# Altium footprint library Connectors THD.PcbLib: 631 footprints (part 16 of 46)
Each footprint in its own frame and in the unit in brackets; x right, y up, seen from the top. Pads: shape width x height; smd on the part's side, far side on the other; paste and mask are expansions set on the pad; w line width, h text height; cw(c..) or ccw(c..) is an arc to the next point about the centre after c.
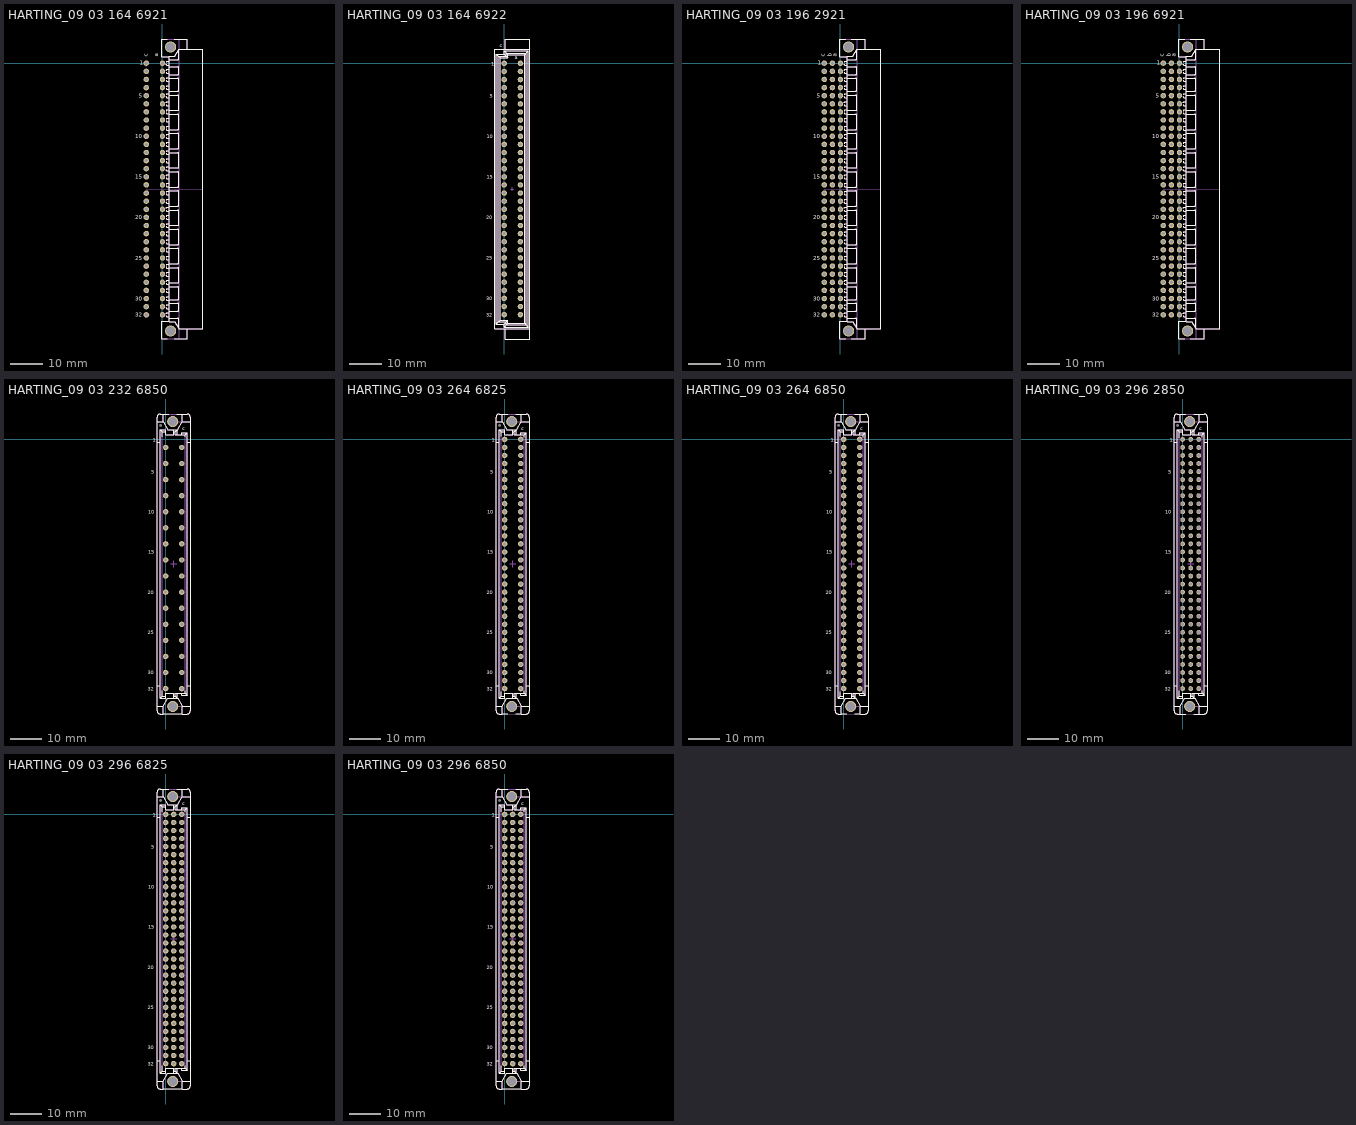
[diagram p15: the footprints below, top view; thin cyan lines are the x and y axes]

## HARTING_09 03 164 6921 [mm] "Connector; DIN 41612, Type C, Thru-Hole; Rows a+c, 64 Position; Right Angle"
height 9.35
pads (66):
  round 1.7 hole 1: a1(0,0) a2(0,-2.54) a3(0,-5.08) a4(0,-7.62) a5(0,-10.16) a6(0,-12.7) a7(0,-15.24) a8(0,-17.78) a9(0,-20.32) a10(0,-22.86) a11(0,-25.4) a12(0,-27.94) a13(0,-30.48) a14(0,-33.02) a15(0,-35.56) a16(0,-38.1) a17(0,-40.64) a18(0,-43.18) a19(0,-45.72) a20(0,-48.26) a21(0,-50.8) a22(0,-53.34) a23(0,-55.88) a24(0,-58.42) a25(0,-60.96) a26(0,-63.5) a27(0,-66.04) a28(0,-68.58) a29(0,-71.12) a30(0,-73.66) a31(0,-76.2) a32(0,-78.74) c1(-5.08,0) c2(-5.08,-2.54) c3(-5.08,-5.08) c4(-5.08,-7.62) c5(-5.08,-10.16) c6(-5.08,-12.7) c7(-5.08,-15.24) c8(-5.08,-17.78) c9(-5.08,-20.32) c10(-5.08,-22.86) c11(-5.08,-25.4) c12(-5.08,-27.94) c13(-5.08,-30.48) c14(-5.08,-33.02) c15(-5.08,-35.56) c16(-5.08,-38.1) c17(-5.08,-40.64) c18(-5.08,-43.18) c19(-5.08,-45.72) c20(-5.08,-48.26) c21(-5.08,-50.8) c22(-5.08,-53.34) c23(-5.08,-55.88) c24(-5.08,-58.42) c25(-5.08,-60.96) c26(-5.08,-63.5) c27(-5.08,-66.04) c28(-5.08,-68.58) c29(-5.08,-71.12) c30(-5.08,-73.66) c31(-5.08,-76.2) c32(-5.08,-78.74)
  round 3.5 / inner round 3.5 / far side round 5.1 hole 2.8: MTG1(2.54,5.08) MTG2(2.54,-83.82)
Top Overlay:
  drawing of 224 lines, arcs and shapes, not listed
  text "1" at -7.045,-0.55 h1.2
  text "c" at -4.58,2.04 h1.2
  text "a" at -1.325,2.09 h1.2
  text "32" at -8.57,-79.39 h1.2
  text "5" at -7.445,-10.86 h1.2
  text "10" at -8.495,-23.51 h1.2
  text "15" at -8.47,-36.11 h1.2
  text "20" at -8.57,-48.91 h1.2
  text "25" at -8.57,-61.61 h1.2
  text "30" at -8.57,-74.31 h1.2
Mechanical 8:
  lines w0.1: -5.08,-79.74 -5.08,-78.74 -4.08,-78.74 ; -5.08,-39.37 12.64,-39.37 ; -5.08,-1 -5.08,0 -4.08,0 ; 0,-79.74 0,-78.74 1,-78.74 ; 0,-1 0,0 1,0 ; 2.54,-84.82 2.54,-83.82 3.54,-83.82 ; 2.54,4.08 2.54,5.08 3.54,5.08 ; 5.3,-86.32 5.3,7.58
  text "PCB" at 5.08,-41.275 h1.2
Mechanical 14:
  drawing of 222 lines, arcs and shapes, not listed
  text "1" at -7.045,-0.55 h1.2
  text "c" at -4.58,2.04 h1.2
  text "a" at -1.325,2.09 h1.2
  text "32" at -8.57,-79.39 h1.2
  text "5" at -7.445,-10.86 h1.2
  text "10" at -8.495,-23.51 h1.2
  text "15" at -8.47,-36.11 h1.2
  text "20" at -8.57,-48.91 h1.2
  text "25" at -8.57,-61.61 h1.2
  text "30" at -8.57,-74.31 h1.2
3D body: height 9.4, standoff -3, extent -5.38,-86.37 12.64,7.63

## HARTING_09 03 164 6922 [mm] "DIN 41612, Type C,  Thru-Hole; Rows a+c, 64 Position, Performance level 2, Lead 3mm, Pitch 2.54mm, Straight Male Connector"
height 13
pads (64):
  round 1.7 hole 1: a1(5.08,0) a2(5.08,-2.54) a3(5.08,-5.08) a4(5.08,-7.62) a5(5.08,-10.16) a6(5.08,-12.7) a7(5.08,-15.24) a8(5.08,-17.78) a9(5.08,-20.32) a10(5.08,-22.86) a11(5.08,-25.4) a12(5.08,-27.94) a13(5.08,-30.48) a14(5.08,-33.02) a15(5.08,-35.56) a16(5.08,-38.1) a17(5.08,-40.64) a18(5.08,-43.18) a19(5.08,-45.72) a20(5.08,-48.26) a21(5.08,-50.8) a22(5.08,-53.34) a23(5.08,-55.88) a24(5.08,-58.42) a25(5.08,-60.96) a26(5.08,-63.5) a27(5.08,-66.04) a28(5.08,-68.58) a29(5.08,-71.12) a30(5.08,-73.66) a31(5.08,-76.2) a32(5.08,-78.74) c1(0,0) c2(0,-2.54) c3(0,-5.08) c4(0,-7.62) c5(0,-10.16) c6(0,-12.7) c7(0,-15.24) c8(0,-17.78) c9(0,-20.32) c10(0,-22.86) c11(0,-25.4) c12(0,-27.94) c13(0,-30.48) c14(0,-33.02) c15(0,-35.56) c16(0,-38.1) c17(0,-40.64) c18(0,-43.18) c19(0,-45.72) c20(0,-48.26) c21(0,-50.8) c22(0,-53.34) c23(0,-55.88) c24(0,-58.42) c25(0,-60.96) c26(0,-63.5) c27(0,-66.04) c28(0,-68.58) c29(0,-71.12) c30(0,-73.66) c31(0,-76.2) c32(0,-78.74)
Top Overlay:
  lines w0.2: 0.39,-83.121 0.39,-86.37 8.04,-86.37 8.04,7.63 0.39,7.63 0.39,4.38 ; 8.04,-83.12 -2.96,-83.12 -2.96,4.38 8.04,4.38 ; -2.46,-81.67 -1.81,-81.02 ; -2.46,-81.67 -0.06,-81.67 ; -2.46,-81.67 -2.46,2.93 ; -2.46,2.93 -1.31,1.78 ; -2.46,2.93 -0.06,2.93 ; -1.81,-81.02 -1.31,-80.52 ; -1.81,-81.02 0.59,-81.02 0.59,-81.97 6.89,-81.97 6.89,3.23 0.59,3.23 0.59,2.28 -1.81,2.28 -1.81,-81.02 ; -1.31,-80.52 1.09,-80.52 ; -1.31,-80.52 -1.31,1.78 ; -1.31,1.78 1.09,1.78 ; -0.06,-82.62 1.09,-81.47 ; -0.06,-82.62 7.54,-82.62 ; -0.06,-82.62 -0.06,-81.67 ; -0.06,-81.67 1.09,-80.52 ; -0.06,2.93 1.09,1.78 ; -0.06,2.93 -0.06,3.88 ; -0.06,3.88 1.09,2.73 ; -0.06,3.88 7.54,3.88 ; 1.09,-81.47 6.39,-81.47 ; 1.09,-81.47 1.09,-80.52 ; 1.09,1.78 1.09,2.73 ; 1.09,2.73 6.39,2.73 ; 6.39,-81.47 7.54,-82.62 ; 6.39,-81.47 6.39,2.73 ; 6.39,2.73 7.54,3.88 ; 7.54,-82.62 7.54,3.88
  text "1" at -4.075,-0.675 h1.2
  text "15" at -5.475,-36.135 h1.2
  text "20" at -5.675,-48.885 h1.2
  text "25" at -5.675,-61.585 h1.2
  text "30" at -5.675,-74.285 h1.2
  text "5" at -4.55,-10.835 h1.2
  text "32" at -5.675,-79.365 h1.2
  text "a" at 3.249,1.235 h1.2
  text "c" at -1.445,5.06 h1.2
  text "10" at -5.475,-23.46 h1.2
Mechanical 8:
  drawing of 260 lines, arcs and shapes, not listed
Mechanical 14:
  lines w0.1: 0.39,-83.121 0.39,-86.37 8.04,-86.37 8.04,7.63 0.39,7.63 0.39,4.38 ; 8.04,-83.12 -2.96,-83.12 -2.96,4.38 8.04,4.38 ; -2.46,-81.67 -1.81,-81.02 ; -2.46,-81.67 -0.06,-81.67 ; -2.46,-81.67 -2.46,2.93 ; -2.46,2.93 -1.31,1.78 ; -2.46,2.93 -0.06,2.93 ; -1.81,-81.02 -1.31,-80.52 ; -1.81,-81.02 0.59,-81.02 0.59,-81.97 6.89,-81.97 6.89,3.23 0.59,3.23 0.59,2.28 -1.81,2.28 -1.81,-81.02 ; -1.31,-80.52 1.09,-80.52 ; -1.31,-80.52 -1.31,1.78 ; -1.31,1.78 1.09,1.78 ; -0.06,-82.62 1.09,-81.47 ; -0.06,-82.62 7.54,-82.62 ; -0.06,-82.62 -0.06,-81.67 ; -0.06,-81.67 1.09,-80.52 ; -0.06,2.93 1.09,1.78 ; -0.06,2.93 -0.06,3.88 ; -0.06,3.88 1.09,2.73 ; -0.06,3.88 7.54,3.88 ; 1.09,-81.47 6.39,-81.47 ; 1.09,-81.47 1.09,-80.52 ; 1.09,1.78 1.09,2.73 ; 1.09,2.73 6.39,2.73 ; 6.39,-81.47 7.54,-82.62 ; 6.39,-81.47 6.39,2.73 ; 6.39,2.73 7.54,3.88 ; 7.54,-82.62 7.54,3.88
  text "c" at -1.445,5.06 h1.2
  text "a" at 3.249,1.235 h1.2
  text "1" at -4.075,-0.675 h1.2
  text "15" at -5.475,-36.135 h1.2
  text "20" at -5.675,-48.885 h1.2
  text "25" at -5.675,-61.585 h1.2
  text "30" at -5.675,-74.285 h1.2
  text "5" at -4.55,-10.835 h1.2
  text "32" at -5.675,-79.365 h1.2
  text "10" at -5.475,-23.46 h1.2
3D body: height 13, standoff -3, extent -2.96,-86.37 8.04,7.63

## HARTING_09 03 196 2921 [mm] "Connector; DIN 41612, Type C, Thru-Hole; Rows a+b+c, 96 Position; Right Angle"
height 11
pads (98):
  round 1.7 hole 1: a1(0,0) a2(0,-2.54) a3(0,-5.08) a4(0,-7.62) a5(0,-10.16) a6(0,-12.7) a7(0,-15.24) a8(0,-17.78) a9(0,-20.32) a10(0,-22.86) a11(0,-25.4) a12(0,-27.94) a13(0,-30.48) a14(0,-33.02) a15(0,-35.56) a16(0,-38.1) a17(0,-40.64) a18(0,-43.18) a19(0,-45.72) a20(0,-48.26) a21(0,-50.8) a22(0,-53.34) a23(0,-55.88) a24(0,-58.42) a25(0,-60.96) a26(0,-63.5) a27(0,-66.04) a28(0,-68.58) a29(0,-71.12) a30(0,-73.66) a31(0,-76.2) a32(0,-78.74) b1(-2.54,0) b2(-2.54,-2.54) b3(-2.54,-5.08) b4(-2.54,-7.62) b5(-2.54,-10.16) b6(-2.54,-12.7) b7(-2.54,-15.24) b8(-2.54,-17.78) b9(-2.54,-20.32) b10(-2.54,-22.86) b11(-2.54,-25.4) b12(-2.54,-27.94) b13(-2.54,-30.48) b14(-2.54,-33.02) b15(-2.54,-35.56) b16(-2.54,-38.1) b17(-2.54,-40.64) b18(-2.54,-43.18) b19(-2.54,-45.72) b20(-2.54,-48.26) b21(-2.54,-50.8) b22(-2.54,-53.34) b23(-2.54,-55.88) b24(-2.54,-58.42) b25(-2.54,-60.96) b26(-2.54,-63.5) b27(-2.54,-66.04) b28(-2.54,-68.58) b29(-2.54,-71.12) b30(-2.54,-73.66) b31(-2.54,-76.2) b32(-2.54,-78.74) c1(-5.08,0) c2(-5.08,-2.54) c3(-5.08,-5.08) c4(-5.08,-7.62) c5(-5.08,-10.16) c6(-5.08,-12.7) c7(-5.08,-15.24) c8(-5.08,-17.78) c9(-5.08,-20.32) c10(-5.08,-22.86) c11(-5.08,-25.4) c12(-5.08,-27.94) c13(-5.08,-30.48) c14(-5.08,-33.02) c15(-5.08,-35.56) c16(-5.08,-38.1) c17(-5.08,-40.64) c18(-5.08,-43.18) c19(-5.08,-45.72) c20(-5.08,-48.26) c21(-5.08,-50.8) c22(-5.08,-53.34) c23(-5.08,-55.88) c24(-5.08,-58.42) c25(-5.08,-60.96) c26(-5.08,-63.5) c27(-5.08,-66.04) c28(-5.08,-68.58) c29(-5.08,-71.12) c30(-5.08,-73.66) c31(-5.08,-76.2) c32(-5.08,-78.74)
  round 3.5 / inner round 3.5 / far side round 5.1 hole 2.8: MTG1(2.54,5.08) MTG2(2.54,-83.82)
Top Overlay:
  drawing of 227 lines, arcs and shapes, not listed
  text "30" at -8.57,-74.31 h1.2
  text "25" at -8.57,-61.61 h1.2
  text "20" at -8.57,-48.91 h1.2
  text "15" at -8.47,-36.11 h1.2
  text "10" at -8.495,-23.51 h1.2
  text "5" at -7.445,-10.86 h1.2
  text "32" at -8.57,-79.39 h1.2
  text "1" at -7.045,-0.55 h1.2
  text "c" at -4.9,2.025 h1.2
  text "b" at -2.75,2.08 h1.2
  text "a" at -1.175,2.05 h1.2
Mechanical 8:
  lines w0.1: -5.08,-39.37 12.64,-39.37 ; 5.3,-86.3 5.3,7.5
  text "PCB" at 5.08,-41.275 h1.2
Mechanical 14:
  drawing of 161 lines, arcs and shapes, not listed
  text "a" at -1.175,2.05 h1.2
  text "b" at -2.75,2.08 h1.2
  text "c" at -4.9,2.025 h1.2
  text "30" at -8.57,-74.31 h1.2
  text "25" at -8.57,-61.61 h1.2
  text "20" at -8.57,-48.91 h1.2
  text "15" at -8.47,-36.11 h1.2
  text "10" at -8.495,-23.51 h1.2
  text "5" at -7.445,-10.86 h1.2
  text "32" at -8.57,-79.39 h1.2
  text "1" at -7.045,-0.55 h1.2
  text "c" at -4.445,-0.635 h1.2
  text "a" at 0.635,-0.635 h1.2
3D body: height 9.35, standoff -3, extent -5.38,-86.37 12.64,7.63

## HARTING_09 03 196 6921 [mm] "Connector; DIN 41612, Type C, Thru-Hole; Rows a+b+c, 96 Position; Right Angle"
height 11
pads (98):
  round 1.7 hole 1: a1(0,0) a2(0,-2.54) a3(0,-5.08) a4(0,-7.62) a5(0,-10.16) a6(0,-12.7) a7(0,-15.24) a8(0,-17.78) a9(0,-20.32) a10(0,-22.86) a11(0,-25.4) a12(0,-27.94) a13(0,-30.48) a14(0,-33.02) a15(0,-35.56) a16(0,-38.1) a17(0,-40.64) a18(0,-43.18) a19(0,-45.72) a20(0,-48.26) a21(0,-50.8) a22(0,-53.34) a23(0,-55.88) a24(0,-58.42) a25(0,-60.96) a26(0,-63.5) a27(0,-66.04) a28(0,-68.58) a29(0,-71.12) a30(0,-73.66) a31(0,-76.2) a32(0,-78.74) b1(-2.54,0) b2(-2.54,-2.54) b3(-2.54,-5.08) b4(-2.54,-7.62) b5(-2.54,-10.16) b6(-2.54,-12.7) b7(-2.54,-15.24) b8(-2.54,-17.78) b9(-2.54,-20.32) b10(-2.54,-22.86) b11(-2.54,-25.4) b12(-2.54,-27.94) b13(-2.54,-30.48) b14(-2.54,-33.02) b15(-2.54,-35.56) b16(-2.54,-38.1) b17(-2.54,-40.64) b18(-2.54,-43.18) b19(-2.54,-45.72) b20(-2.54,-48.26) b21(-2.54,-50.8) b22(-2.54,-53.34) b23(-2.54,-55.88) b24(-2.54,-58.42) b25(-2.54,-60.96) b26(-2.54,-63.5) b27(-2.54,-66.04) b28(-2.54,-68.58) b29(-2.54,-71.12) b30(-2.54,-73.66) b31(-2.54,-76.2) b32(-2.54,-78.74) c1(-5.08,0) c2(-5.08,-2.54) c3(-5.08,-5.08) c4(-5.08,-7.62) c5(-5.08,-10.16) c6(-5.08,-12.7) c7(-5.08,-15.24) c8(-5.08,-17.78) c9(-5.08,-20.32) c10(-5.08,-22.86) c11(-5.08,-25.4) c12(-5.08,-27.94) c13(-5.08,-30.48) c14(-5.08,-33.02) c15(-5.08,-35.56) c16(-5.08,-38.1) c17(-5.08,-40.64) c18(-5.08,-43.18) c19(-5.08,-45.72) c20(-5.08,-48.26) c21(-5.08,-50.8) c22(-5.08,-53.34) c23(-5.08,-55.88) c24(-5.08,-58.42) c25(-5.08,-60.96) c26(-5.08,-63.5) c27(-5.08,-66.04) c28(-5.08,-68.58) c29(-5.08,-71.12) c30(-5.08,-73.66) c31(-5.08,-76.2) c32(-5.08,-78.74)
  round 3.5 / inner round 3.5 / far side round 5.1 hole 2.8: MTG1(2.54,5.08) MTG2(2.54,-83.82)
Top Overlay:
  drawing of 227 lines, arcs and shapes, not listed
  text "30" at -8.57,-74.31 h1.2
  text "25" at -8.57,-61.61 h1.2
  text "20" at -8.57,-48.91 h1.2
  text "15" at -8.47,-36.11 h1.2
  text "10" at -8.495,-23.51 h1.2
  text "5" at -7.445,-10.86 h1.2
  text "32" at -8.57,-79.39 h1.2
  text "1" at -7.045,-0.55 h1.2
  text "c" at -4.9,2.025 h1.2
  text "b" at -2.75,2.08 h1.2
  text "a" at -1.175,2.05 h1.2
Mechanical 8:
  lines w0.1: -5.08,-39.37 12.64,-39.37 ; 5.3,-86.3 5.3,7.5
  text "PCB" at 5.08,-41.275 h1.2
Mechanical 14:
  drawing of 161 lines, arcs and shapes, not listed
  text "a" at -1.175,2.05 h1.2
  text "b" at -2.75,2.08 h1.2
  text "c" at -4.9,2.025 h1.2
  text "30" at -8.57,-74.31 h1.2
  text "25" at -8.57,-61.61 h1.2
  text "20" at -8.57,-48.91 h1.2
  text "15" at -8.47,-36.11 h1.2
  text "10" at -8.495,-23.51 h1.2
  text "5" at -7.445,-10.86 h1.2
  text "32" at -8.57,-79.39 h1.2
  text "1" at -7.045,-0.55 h1.2
  text "c" at -4.445,-0.635 h1.2
  text "a" at 0.635,-0.635 h1.2
3D body: height 9.35, standoff -3, extent -5.38,-86.37 12.64,7.63

## HARTING_09 03 232 6850 [mm] "DIN 41612, Type C,  Thru-Hole Press-in Terminations; Rows a+c, 32 Position, Performance level 2, Lead 4.5mm, Pitch 2.54mm, Straight Female Connector"
height 11.6
pads (34):
  round 1.7 hole 1: a2(0,-2.54) a4(0,-7.62) a6(0,-12.7) a8(0,-17.78) a10(0,-22.86) a12(0,-27.94) a14(0,-33.02) a16(0,-38.1) a18(0,-43.18) a20(0,-48.26) a22(0,-53.34) a24(0,-58.42) a26(0,-63.5) a28(0,-68.58) a30(0,-73.66) a32(0,-78.74) c2(5.08,-2.54) c4(5.08,-7.62) c6(5.08,-12.7) c8(5.08,-17.78) c10(5.08,-22.86) c12(5.08,-27.94) c14(5.08,-33.02) c16(5.08,-38.1) c18(5.08,-43.18) c20(5.08,-48.26) c22(5.08,-53.34) c24(5.08,-58.42) c26(5.08,-63.5) c28(5.08,-68.58) c30(5.08,-73.66) c32(5.08,-78.74)
  round 3.5 / inner round 3.5 / far side round 5.1 hole 2.8: MTG1(2.24,5.63) MTG2(2.24,-84.37)
Top Overlay:
  lines w0.2: -2.71,-84.37 -0.735,-84.37 ; -2.71,-77.87 -1.685,-77.87 ; -1.685,-0.87 -2.71,-0.87 -2.71,5.63 -0.735,5.63 ; -1.035,-79.4 -1.035,-81.195 ; -1.035,0.775 -1.035,2.455 ; 1,8.03 -0.735,8.03 ; 2.54,-81.845 2.54,-81.195 ; 2.54,3.105 2.54,2.455 ; 3.5,8.03 5.215,8.03 ; 3.665,-80.145 3.665,-81.845 3.015,-81.195 ; 3.665,1.405 3.665,3.105 3.015,2.455 ; 6.115,-79.425 6.115,-80.145 ; 6.115,0.825 6.115,1.405 ; 6.765,-77.87 7.79,-77.87 ; 6.765,-0.87 7.79,-0.87 ; 7.79,-84.37 5.215,-84.37 ; 7.79,5.63 5.215,5.63 ; -1.685,-81.845 -1.685,3.105 ; -1.685,-81.845 -1.035,-81.195 ; -1.685,-81.845 0,-81.845 0,-81.195 ; -1.685,3.105 0,3.105 0,2.455 ; -1.685,3.105 -1.035,2.455 ; -1.035,-81.195 0,-81.195 ; -1.035,2.455 0,2.455 ; -0.735,-86.77 -0.735,-84.37 ; -0.735,-86.77 5.215,-86.77 ; -0.735,-86.77 -1.71,-86.77 cw(c-1.71,-85.77) -2.71,-85.77 -2.71,7.03 cw(c-1.71,7.03) -1.71,8.03 -0.735,8.03 ; -0.735,-84.37 0.723,-81.845 3.757,-81.845 5.215,-84.37 ; -0.735,5.63 -0.735,8.03 ; -0.735,5.63 0.723,3.105 3.757,3.105 5.215,5.63 ; 0,-81.195 0,-80.145 2.54,-80.145 2.54,-81.195 ; 0,2.455 0,1.405 2.54,1.405 2.54,2.455 ; 2.54,-81.195 3.015,-81.195 ; 2.54,2.455 3.015,2.455 ; 3.015,-81.195 3.015,-80.145 5.08,-80.145 ; 3.015,2.455 3.015,1.405 5.08,1.405 ; 5.08,-80.145 6.115,-80.145 ; 5.08,-80.145 5.08,-80.795 6.765,-80.795 ; 5.08,1.405 5.08,2.055 6.765,2.055 ; 5.08,1.405 6.115,1.405 ; 5.215,-86.77 5.215,-84.37 ; 5.215,-86.77 6.79,-86.77 ccw(c6.79,-85.77) 7.79,-85.77 7.79,7.03 ccw(c6.79,7.03) 6.79,8.03 5.215,8.03 ; 5.215,5.63 5.215,8.03 ; 6.115,-80.145 6.765,-80.795 ; 6.115,1.405 6.765,2.055 ; 6.765,-80.795 6.765,2.055
  text "a" at -1.951,3.96 h1.2
  text "c" at 5.305,2.935 h1.2
  text "10" at -5.475,-23.46 h1.2
  text "32" at -5.675,-79.365 h1.2
  text "5" at -4.55,-10.835 h1.2
  text "30" at -5.675,-74.285 h1.2
  text "25" at -5.675,-61.585 h1.2
  text "20" at -5.675,-48.885 h1.2
  text "15" at -5.475,-36.135 h1.2
  text "1" at -4.075,-0.675 h1.2
Mechanical 8:
  lines w0.1: 1.54,-39.37 2.54,-39.37 ; 2.24,-84.37 4.78,-84.37 ; 2.24,5.63 4.78,5.63 ; 2.54,-40.37 2.54,-39.37 ; 2.54,-38.37 2.54,-39.37 ; 3.54,-39.37 2.54,-39.37
Mechanical 14:
  circle w0.1: c2.24,5.63 r1.425
  circle w0.1: c2.24,-84.37 r1.425
  lines w0.1: -2.71,-84.37 -0.735,-84.37 ; -2.71,5.63 -0.735,5.63 ; -0.735,-86.77 -0.735,-84.37 ; -0.735,8.03 -0.735,5.63 ; 3.665,-80.145 3.665,-81.845 ; 3.665,1.405 3.665,3.105 3.015,2.455 ; 3.757,3.105 5.215,5.63 ; 5.215,-86.77 5.215,-84.37 ; 5.215,8.03 5.215,5.63 ; 7.79,-84.37 5.215,-84.37 ; 7.79,5.63 5.215,5.63 ; -1.685,-81.845 -1.685,3.105 ; -1.685,-81.845 0,-81.845 0,-81.195 ; -1.685,-81.845 -1.035,-81.195 ; -1.685,3.105 0,3.105 0,2.455 ; -1.685,3.105 -1.035,2.455 ; -1.035,-81.195 0,-81.195 ; -1.035,-81.195 -1.035,2.455 ; -1.035,2.455 0,2.455 ; -0.735,-84.37 0.723,-81.845 2.54,-81.845 ; -0.735,5.63 0.723,3.105 2.54,3.105 2.54,2.455 ; 0,-81.195 0,-80.145 2.54,-80.145 2.54,-81.195 ; 0,2.455 0,1.405 2.54,1.405 2.54,2.455 ; 2.54,-81.845 3.665,-81.845 ; 2.54,-81.845 2.54,-81.195 ; 2.54,-81.195 3.015,-81.195 ; 2.54,2.455 3.015,2.455 ; 3.015,-81.195 3.665,-81.845 ; 3.015,-81.195 3.015,-80.145 5.08,-80.145 ; 3.015,2.455 3.015,1.405 5.08,1.405 ; 3.665,-81.845 3.757,-81.845 5.215,-84.37 ; 5.08,-80.145 5.08,-80.795 6.765,-80.795 ; 5.08,-80.145 6.115,-80.145 ; 5.08,1.405 5.08,2.055 6.765,2.055 ; 5.08,1.405 6.115,1.405 ; 6.115,-80.145 6.765,-80.795 ; 6.115,-80.145 6.115,1.405 ; 6.115,1.405 6.765,2.055 ; 6.765,-80.795 6.765,2.055 ; -2.71,-85.77 ccw(c-1.71,-85.77) -1.71,-86.77 6.79,-86.77 ccw(c6.79,-85.77) 7.79,-85.77 7.79,7.03 ccw(c6.79,7.03) 6.79,8.03 -1.71,8.03 ccw(c-1.71,7.03) -2.71,7.03 -2.71,-85.77
  text "a" at -1.951,3.96 h1.2
  text "c" at 5.305,2.935 h1.2
  text "10" at -5.475,-23.46 h1.2
  text "32" at -5.675,-79.365 h1.2
  text "5" at -4.55,-10.835 h1.2
  text "30" at -5.675,-74.285 h1.2
  text "25" at -5.675,-61.585 h1.2
  text "20" at -5.675,-48.885 h1.2
  text "15" at -5.475,-36.135 h1.2
  text "1" at -4.075,-0.675 h1.2
Drill Drawing:
  lines w0.1: -2.54,-58.42 -2.54,-81.28 7.62,-81.28 7.62,2.54 -2.54,2.54 -2.54,-20.32
  text "PRESS-FIT TECHNOLOGY diam. 1mm +0.1 -0" at -1.905,-56.515 h1
3D body: height 11.6, standoff -4.5, extent -2.71,-86.82 7.79,8.08

## HARTING_09 03 264 6825 [mm] "DIN 41612, Type C, Thru-Hole; Rows a+c, 64 Position, Straight Female Connector"
height 11.6
pads (66):
  round 1.7 hole 1: a1(0,0) a2(0,-2.54) a3(0,-5.08) a4(0,-7.62) a5(0,-10.16) a6(0,-12.7) a7(0,-15.24) a8(0,-17.78) a9(0,-20.32) a10(0,-22.86) a11(0,-25.4) a12(0,-27.94) a13(0,-30.48) a14(0,-33.02) a15(0,-35.56) a16(0,-38.1) a17(0,-40.64) a18(0,-43.18) a19(0,-45.72) a20(0,-48.26) a21(0,-50.8) a22(0,-53.34) a23(0,-55.88) a24(0,-58.42) a25(0,-60.96) a26(0,-63.5) a27(0,-66.04) a28(0,-68.58) a29(0,-71.12) a30(0,-73.66) a31(0,-76.2) a32(0,-78.74) c1(5.08,0) c2(5.08,-2.54) c3(5.08,-5.08) c4(5.08,-7.62) c5(5.08,-10.16) c6(5.08,-12.7) c7(5.08,-15.24) c8(5.08,-17.78) c9(5.08,-20.32) c10(5.08,-22.86) c11(5.08,-25.4) c12(5.08,-27.94) c13(5.08,-30.48) c14(5.08,-33.02) c15(5.08,-35.56) c16(5.08,-38.1) c17(5.08,-40.64) c18(5.08,-43.18) c19(5.08,-45.72) c20(5.08,-48.26) c21(5.08,-50.8) c22(5.08,-53.34) c23(5.08,-55.88) c24(5.08,-58.42) c25(5.08,-60.96) c26(5.08,-63.5) c27(5.08,-66.04) c28(5.08,-68.58) c29(5.08,-71.12) c30(5.08,-73.66) c31(5.08,-76.2) c32(5.08,-78.74)
  round 3.5 / inner round 3.5 / far side round 5.1 hole 2.8: MTG1(2.24,5.63) MTG2(2.24,-84.37)
Top Overlay:
  lines w0.2: -2.71,-84.37 -0.735,-84.37 ; -2.71,-77.87 -1.685,-77.87 ; -1.685,-0.87 -2.71,-0.87 -2.71,5.63 -0.735,5.63 ; -1.035,-79.775 -1.035,-81.195 ; -1.035,1.035 -1.035,2.455 ; -0.736,-86.77 0.999,-86.77 ; 1,8.03 -0.735,8.03 ; 2.54,-81.845 2.54,-81.195 ; 2.54,3.105 2.54,2.455 ; 3.499,-86.77 5.214,-86.77 ; 3.5,8.03 5.215,8.03 ; 3.665,-80.145 3.665,-81.845 3.015,-81.195 ; 3.665,1.405 3.665,3.105 3.015,2.455 ; 6.115,-79.35 6.115,-80.145 ; 6.115,0.61 6.115,1.405 ; 6.765,-77.87 7.79,-77.87 ; 6.765,-0.87 7.79,-0.87 ; 7.79,-84.37 5.215,-84.37 ; 7.79,5.63 5.215,5.63 ; -1.685,-81.845 0,-81.845 0,-81.195 ; -1.685,-81.845 -1.035,-81.195 ; -1.685,-81.845 -1.685,3.105 ; -1.685,3.105 -1.035,2.455 ; -1.685,3.105 0,3.105 0,2.455 ; -1.035,-81.195 0,-81.195 ; -1.035,2.455 0,2.455 ; -0.735,-84.37 -0.735,-86.77 -1.71,-86.77 cw(c-1.71,-85.77) -2.71,-85.77 -2.71,7.03 cw(c-1.71,7.03) -1.71,8.03 -0.735,8.03 ; -0.735,-84.37 0.723,-81.845 3.757,-81.845 5.215,-84.37 ; -0.735,5.63 0.723,3.105 3.757,3.105 5.215,5.63 ; -0.735,5.63 -0.735,8.03 ; 0,-81.195 0,-80.145 2.54,-80.145 2.54,-81.195 ; 0,2.455 0,1.405 2.54,1.405 2.54,2.455 ; 2.54,-81.195 3.015,-81.195 ; 2.54,2.455 3.015,2.455 ; 3.015,-81.195 3.015,-80.145 5.08,-80.145 ; 3.015,2.455 3.015,1.405 5.08,1.405 ; 5.08,-80.145 5.08,-80.795 6.765,-80.795 ; 5.08,-80.145 6.115,-80.145 ; 5.08,1.405 6.115,1.405 ; 5.08,1.405 5.08,2.055 6.765,2.055 ; 5.215,-84.37 5.215,-86.77 6.79,-86.77 ccw(c6.79,-85.77) 7.79,-85.77 7.79,7.03 ccw(c6.79,7.03) 6.79,8.03 5.215,8.03 ; 5.215,5.63 5.215,8.03 ; 6.115,-80.145 6.765,-80.795 ; 6.115,1.405 6.765,2.055 ; 6.765,-80.795 6.765,2.055
  text "1" at -4.075,-0.675 h1.2
  text "15" at -5.475,-36.135 h1.2
  text "20" at -5.675,-48.885 h1.2
  text "25" at -5.675,-61.585 h1.2
  text "30" at -5.675,-74.285 h1.2
  text "5" at -4.55,-10.835 h1.2
  text "32" at -5.675,-79.365 h1.2
  text "10" at -5.475,-23.46 h1.2
  text "c" at 5.305,2.935 h1.2
  text "a" at -1.951,3.96 h1.2
Mechanical 8:
  lines w0.1: 1.54,-39.37 2.54,-39.37 ; 2.24,-84.37 4.78,-84.37 ; 2.24,5.63 4.78,5.63 ; 2.54,-40.37 2.54,-39.37 ; 2.54,-38.37 2.54,-39.37 ; 3.54,-39.37 2.54,-39.37
Mechanical 14:
  circle w0.1: c2.24,-84.37 r1.425
  circle w0.1: c2.24,5.63 r1.425
  lines w0.1: -2.71,-84.37 -0.735,-84.37 ; -2.71,5.63 -0.735,5.63 ; -0.735,-86.77 -0.735,-84.37 ; -0.735,8.03 -0.735,5.63 ; 3.665,-80.145 3.665,-81.845 ; 3.665,1.405 3.665,3.105 3.015,2.455 ; 3.757,3.105 5.215,5.63 ; 5.215,-86.77 5.215,-84.37 ; 5.215,8.03 5.215,5.63 ; 7.79,-84.37 5.215,-84.37 ; 7.79,5.63 5.215,5.63 ; -1.685,-81.845 -1.035,-81.195 ; -1.685,-81.845 0,-81.845 0,-81.195 ; -1.685,-81.845 -1.685,3.105 ; -1.685,3.105 -1.035,2.455 ; -1.685,3.105 0,3.105 0,2.455 ; -1.035,-81.195 -1.035,2.455 ; -1.035,-81.195 0,-81.195 ; -1.035,2.455 0,2.455 ; -0.735,-84.37 0.723,-81.845 2.54,-81.845 ; -0.735,5.63 0.723,3.105 2.54,3.105 2.54,2.455 ; 0,-81.195 0,-80.145 2.54,-80.145 2.54,-81.195 ; 0,2.455 0,1.405 2.54,1.405 2.54,2.455 ; 2.54,-81.845 2.54,-81.195 ; 2.54,-81.845 3.665,-81.845 ; 2.54,-81.195 3.015,-81.195 ; 2.54,2.455 3.015,2.455 ; 3.015,-81.195 3.015,-80.145 5.08,-80.145 ; 3.015,-81.195 3.665,-81.845 ; 3.015,2.455 3.015,1.405 5.08,1.405 ; 3.665,-81.845 3.757,-81.845 5.215,-84.37 ; 5.08,-80.145 6.115,-80.145 ; 5.08,-80.145 5.08,-80.795 6.765,-80.795 ; 5.08,1.405 6.115,1.405 ; 5.08,1.405 5.08,2.055 6.765,2.055 ; 6.115,-80.145 6.115,1.405 ; 6.115,-80.145 6.765,-80.795 ; 6.115,1.405 6.765,2.055 ; 6.765,-80.795 6.765,2.055 ; -2.71,-85.77 ccw(c-1.71,-85.77) -1.71,-86.77 6.79,-86.77 ccw(c6.79,-85.77) 7.79,-85.77 7.79,7.03 ccw(c6.79,7.03) 6.79,8.03 -1.71,8.03 ccw(c-1.71,7.03) -2.71,7.03 -2.71,-85.77